# Altium footprint library OT Library.PcbLib: 396 footprints (part 11 of 25)
Each footprint in its own frame and in the unit in brackets; x right, y up, seen from the top. Pads: shape width x height; smd on the part's side, far side on the other; paste and mask are expansions set on the pad; w line width, h text height; cw(c..) or ccw(c..) is an arc to the next point about the centre after c.
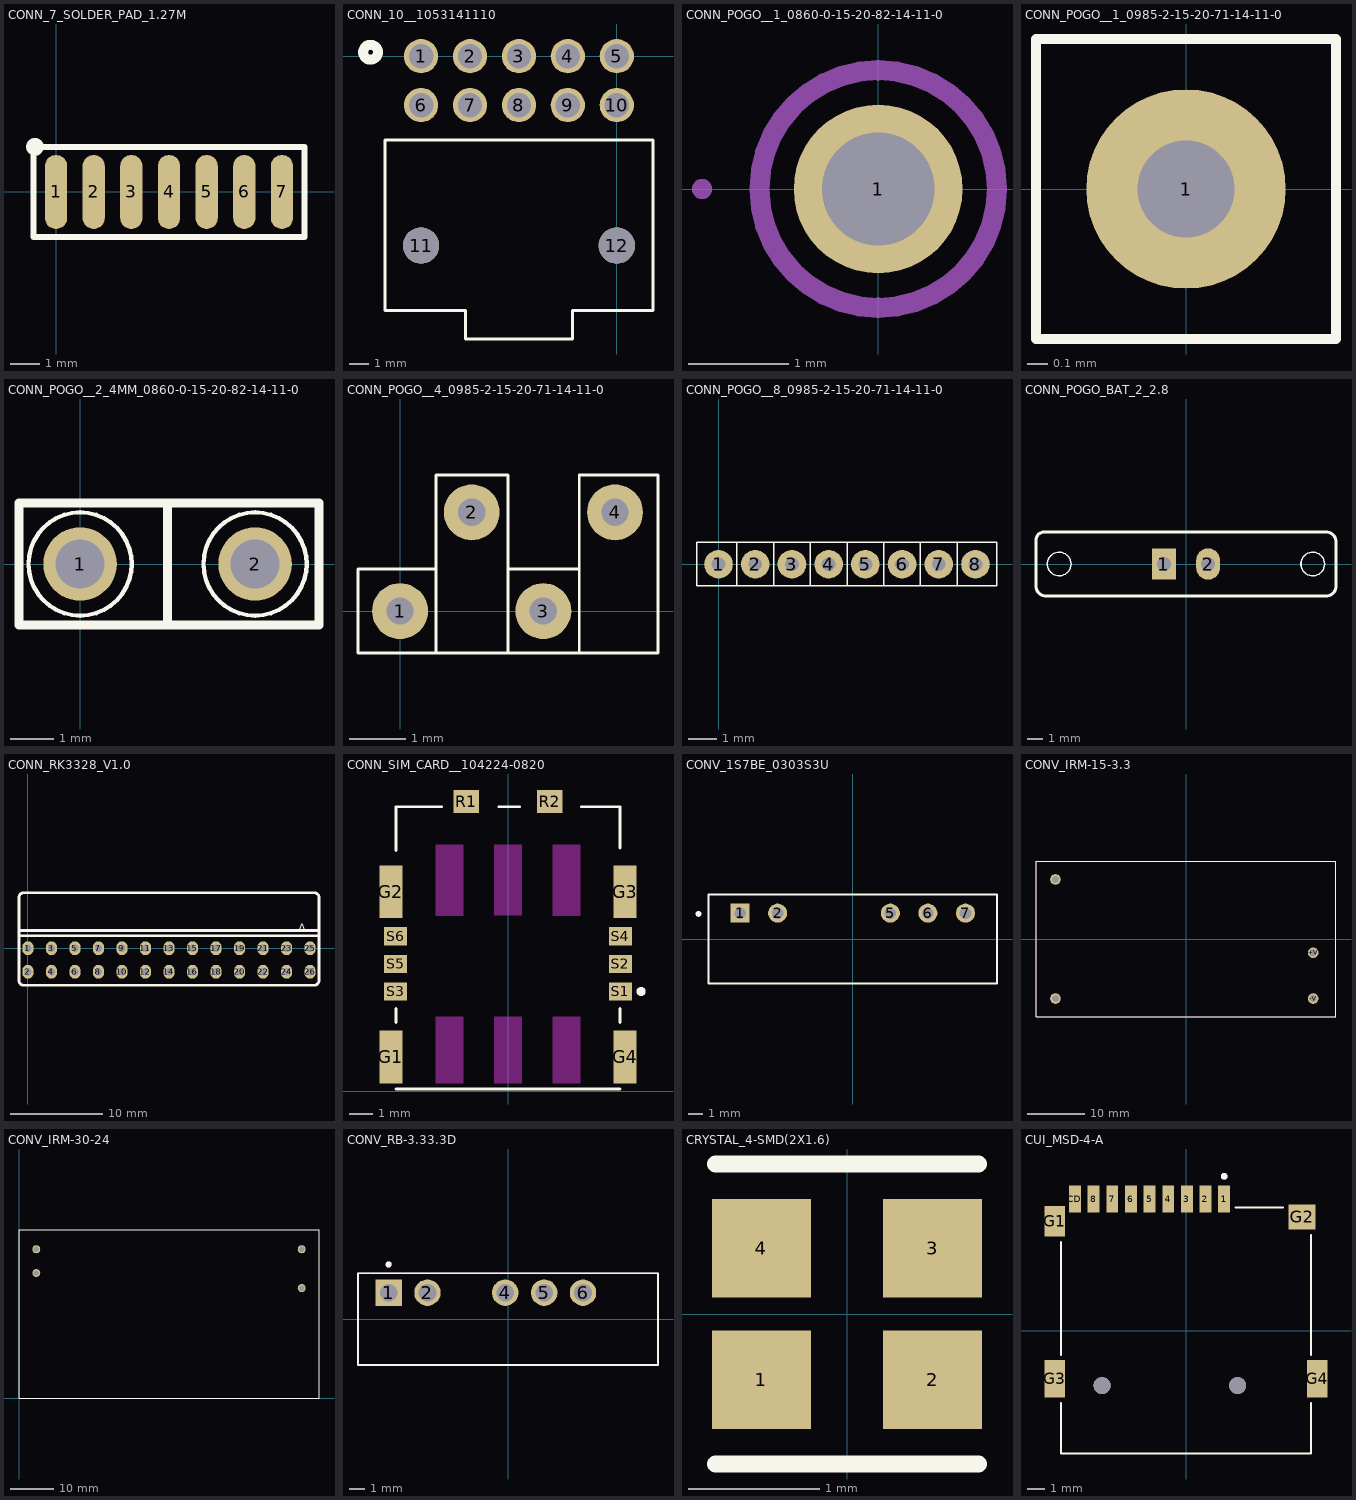
[diagram p10: the footprints below, top view; thin cyan lines are the x and y axes]

## CONN_7_SOLDER_PAD_1.27M [mm] "2.5MMX0.75MM"
pads (7):
  oval 0.75x2.5 smd: 1(0,0) 2(1.27,0) 3(2.54,0) 4(3.81,0) 5(5.08,0) 6(6.35,0) 7(7.62,0)
Top Overlay:
  circle w0.2: c-0.708,1.524 r0.2
  lines w0.2: -0.762,-1.524 8.382,-1.524 8.382,1.524 -0.762,1.524 -0.762,-1.524

## CONN_10__1053141110 [mil]
pads (12):
  round 69 / inner round 60 / far side round 69 hole 49 paste-34.5 mask+0: 1(-393.7,0) 2(-295.28,0) 3(-196.85,0) 4(-98.43,0) 5(0,0) 6(-393.7,-98.43) 7(-295.28,-98.43) 8(-196.85,-98.43) 9(-98.43,-98.43) 10(0,-98.43)
  round 73 / inner round 60 / far side round 73 hole 73 unplated paste+0 mask+0: 11(-393.7,-381.1) 12(0,-381.1)
Top Overlay:
  circle w20: c-495.35,8 r15
  lines w6: -466.35,-512.02 -466.35,-169.02 72.65,-169.02 72.65,-512.02 -89.35,-512.02 -89.35,-569.02 -304.35,-569.02 -304.35,-512.02 -466.35,-512.02
Bottom Overlay:
  circle w20: c-495.35,8 r15
3D body: height 362.2, standoff -123.62, extent -459.56,-564.01 69.57,13.06

## CONN_POGO__1_0860-0-15-20-82-14-11-0 [mm]
pads (1):
  round 1.677 / inner round 1.524 / far side round 1.677 hole 1.118: 1(0,0)
Assembly Top:
  lines w0.1: -1.18,0 cw(c0,0) 1.18,0 cw(c0,0) -1.18,0
Mechanical 22:
  lines w0.1: -1.8,0 ccw(c-1.75,0) -1.7,0 ccw(c-1.75,0) -1.8,0
  lines w0.2: -1.18,0 cw(c0,0) 1.18,0 cw(c0,0) -1.18,0
3D body: height 9.97, standoff -3.17, extent -1.181,-1.181 1.181,1.181

## CONN_POGO__1_0985-2-15-20-71-14-11-0 [mm]
pads (1):
  round 0.991 hole 0.483: 1(0,0)
Top Overlay:
  lines w0.05: -0.746,-0.746 0.746,-0.746 0.746,0.746 -0.746,0.746 -0.746,-0.746
3D body: height 6.27, standoff -4.83, extent -0.546,-0.546 0.546,0.546

## CONN_POGO__2_4MM_0860-0-15-20-82-14-11-0 [mm] "4MM"
pads (2):
  round 1.677 / inner round 1.524 / far side round 1.677 hole 1.118: 1(0,0) 2(4,0)
Top Overlay:
  lines w0.1: -1.18,0 ccw(c0,0) 1.18,0 ccw(c0,0) -1.18,0 ; 2.82,0 ccw(c4,0) 5.18,0 ccw(c4,0) 2.82,0
  lines w0.2: 2,-1.27 2,1.397 ; -1.397,-1.397 5.461,-1.397 5.461,1.397 -1.397,1.397 -1.397,-1.397
3D body: height 9.97, standoff -3.17, extent 2.819,-1.181 5.181,1.181
3D body: height 9.97, standoff -3.17, extent -1.181,-1.181 1.181,1.181

## CONN_POGO__4_0985-2-15-20-71-14-11-0 [mm] "1.27MM"
pads (4):
  round 0.991 hole 0.483: 1(0,0) 2(1.27,1.75) 3(2.54,0) 4(3.81,1.75)
Top Overlay:
  lines w0.05: 0.635,-0.746 0.635,0.746 ; 1.913,-0.746 1.913,0.746 ; 3.175,-0.746 3.175,0.746 ; 4.555,2.413 3.175,2.413 3.175,0.746 ; 4.572,2.413 4.572,0.729 4.572,-0.746 -0.746,-0.746 -0.746,0.746 0.635,0.746 ; 0.635,0.746 0.635,2.413 1.913,2.413 1.913,0.746 ; 1.913,0.746 3.175,0.746
3D body: height 6.27, standoff -4.83, extent -0.546,-0.546 0.546,0.546
3D body: height 6.27, standoff -4.83, extent 0.724,1.204 1.816,2.296
3D body: height 6.27, standoff -4.83, extent 1.994,-0.546 3.086,0.546
3D body: height 6.27, standoff -4.83, extent 3.264,1.204 4.356,2.296

## CONN_POGO__8_0985-2-15-20-71-14-11-0 [mm] "1.27MM"
pads (8):
  round 0.991 hole 0.483: 1(0,0) 2(1.27,0) 3(2.54,0) 4(3.81,0) 5(5.08,0) 6(6.35,0) 7(7.62,0) 8(8.89,0)
Top Overlay:
  lines w0.05: 0.635,-0.746 0.635,0.746 ; 1.913,-0.746 1.913,0.746 ; 3.175,-0.746 3.175,0.746 ; 4.445,-0.746 4.445,0.746 ; 5.723,-0.746 5.723,0.746 ; 6.985,-0.746 6.985,0.746 ; 8.255,-0.746 8.255,0.746 ; -0.746,-0.746 9.636,-0.746 9.636,0.762 -0.746,0.762 -0.746,-0.746
3D body: height 6.27, standoff -4.83, extent 8.344,-0.546 9.436,0.546
3D body: height 6.27, standoff -4.83, extent 7.074,-0.546 8.166,0.546
3D body: height 6.27, standoff -4.83, extent 5.804,-0.546 6.896,0.546
3D body: height 6.27, standoff -4.83, extent 4.534,-0.546 5.626,0.546
3D body: height 6.27, standoff -4.83, extent 3.264,-0.546 4.356,0.546
3D body: height 6.27, standoff -4.83, extent 1.994,-0.546 3.086,0.546
3D body: height 6.27, standoff -4.83, extent 0.724,-0.546 1.816,0.546
3D body: height 6.27, standoff -4.83, extent -0.546,-0.546 0.546,0.546

## CONN_POGO_BAT_2_2.8 [mm]
pads (2):
  rect 1.5x2 hole 0.9: 1(-1.4,0)
  oval 1.5x2 hole 0.9: 2(1.4,0)
Top Overlay:
  circle w0.1: c-8.05,0 r0.75
  circle w0.1: c8.05,0 r0.75
  lines w0.2: -9.525,-1.397 ccw(c-8.89,-1.397) -8.89,-2.032 8.89,-2.032 ccw(c8.89,-1.397) 9.525,-1.397 9.525,1.397 ccw(c8.89,1.397) 8.89,2.032 -9.017,2.032 ccw(c-9.017,1.524) -9.525,1.524 -9.525,0.381 -9.525,-0.381 -9.525,-1.397
3D body: height 4.01, standoff -1.79, extent -9.5,-2 9.5,2

## CONN_RK3328_V1.0 [mm]
pads (26):
  oval 1.2x1.5 hole 0.762: 1(0,0) 2(0,-2.54) 3(2.54,0) 4(2.54,-2.54) 5(5.08,0) 6(5.08,-2.54) 7(7.62,0) 8(7.62,-2.54) 9(10.16,0) 10(10.16,-2.54) 11(12.7,0) 12(12.7,-2.54) 13(15.24,0) 14(15.24,-2.54) 15(17.78,0) 16(17.78,-2.54) 17(20.32,0) 18(20.32,-2.54) 19(22.86,0) 20(22.86,-2.54) 21(25.4,0) 22(25.4,-2.54) 23(27.94,0) 24(27.94,-2.54) 25(30.48,0) 26(30.48,-2.54)
Top Overlay:
  lines w0.3: -0.914,1.346 31.369,1.346 ; -0.884,1.905 31.445,1.905 ; -0.96,-3.5 ccw(c-0.46,-3.5) -0.46,-4 30.94,-4 ccw(c30.94,-3.5) 31.44,-3.5 31.44,5.5 ccw(c30.94,5.5) 30.94,6 -0.46,6 ccw(c-0.46,5.5) -0.96,5.5 -0.96,-3.5
  text "A" at 29.185,1.393 h1.52
Outline:
  lines w0.1: -0.96,-3.5 ccw(c-0.46,-3.5) -0.46,-4 30.94,-4 ccw(c30.94,-3.5) 31.44,-3.5 31.44,5.5 ccw(c30.94,5.5) 30.94,6 -0.46,6 ccw(c-0.46,5.5) -0.96,5.5 -0.96,-3.5
3D body: height 8.51, standoff -2.64, extent -1.486,-3.788 32.042,1.165
3D body: height 19.35, standoff 2.97, extent -1.269,-4.029 31.751,5.971

## CONN_SIM_CARD__104224-0820 [mm]
pads (12):
  rect 1x2.3 smd: G1(-5.1,1.5) G2(-5.1,8.7) G3(5.1,8.7) G4(5.1,1.5)
  rect 1.1x1 smd: R1(-1.82,12.625) R2(1.82,12.625)
  rect 1x0.8 smd: S1(4.9,4.35) S2(4.9,5.55) S3(-4.9,4.35) S4(4.9,6.75) S5(-4.9,5.55) S6(-4.9,6.75)
Top Layer keep-out:
  region: 3.14,7.652 1.94,7.652 1.94,10.75 3.14,10.75
  region: -1.94,7.656 -3.142,7.656 -3.142,10.75 -1.94,10.75
  region: 0.6,7.663 -0.601,7.663 -0.601,10.75 0.6,10.75
  region: 3.14,0.351 1.943,0.351 1.943,3.25 3.14,3.25
  region: -1.94,0.351 -3.146,0.351 -3.146,3.25 -1.94,3.25
  region: 0.6,0.35 -0.601,0.35 -0.601,3.25 0.6,3.25
Top Overlay:
  circle w0.2: c5.8,4.35 r0.1
  lines w0.127: -4.875,0.1 4.875,0.1 ; -4.875,3 -4.875,3.6 ; -4.875,10.5 -4.875,12.4 -2.9,12.4 ; -0.4,12.4 0.5,12.4 ; 3.2,12.4 4.875,12.4 4.875,10.6 ; 4.875,3 4.875,3.6
3D body: height 1.23, standoff 0.02, extent -5.175,0 5.175,12.65

## CONV_1S7BE_0303S3U [mm]
height 10
pads (5):
  rect 1.288x1.288 / inner round 1.288 / far side rect 1.288x1.288 hole 0.78: 1(-7.62,1.75)
  round 1.288 hole 0.78: 2(-5.08,1.75) 5(2.54,1.75) 6(5.08,1.75) 7(7.62,1.75)
Top Overlay:
  circle w0.2: c-10.43,1.7 r0.1
  lines w0.127: -9.75,-3 9.75,-3 9.75,3 -9.75,3 -9.75,-3
3D body: height 10, standoff -2.95, extent -9.652,-3.048 9.652,3.048

## CONV_IRM-15-3.3 [mm]
pads (4):
  round 1.86 hole 1.24: +V(22.2,-2.4) -V(22.2,-10.4) AC/L(-22.8,10.4) AC/N(-22.8,-10.4)
Top Overlay:
  lines w0.127: -26.2,-13.6 -26.2,13.6 26.2,13.6 26.2,-13.6 -26.2,-13.6
3D Top:
  lines w0.127: -26.2,-13.6 26.2,-13.6 26.2,13.6 -26.2,13.6 -26.2,-13.6
3D body: height 24, standoff -3.5, extent -26.2,-13.6 26.2,13.6

## CONV_IRM-30-24 [mm]
pads (4):
  round 1.86 hole 1.24: +V(65.5,25.5) -V(65.5,34.5) AC/L(4,34.5) AC/N(4,29)
Top Overlay:
  lines w0.2: 0,0 0,39 69.5,39 69.5,0 0,0
3D body: height 24, standoff -3.5, extent 0.073,-0.044 69.573,38.956

## CONV_RB-3.33.3D [mm]
pads (5):
  rect 1.73x1.73 hole 1.15: 1(-7.8,1.73)
  round 1.73 hole 1.15: 2(-5.26,1.73) 4(-0.18,1.73) 5(2.36,1.73) 6(4.9,1.73)
Top Overlay:
  circle w0.2: c-7.8,3.575 r0.1
  lines w0.127: -9.8,-3 -9.8,3 9.8,3 9.8,-3 -9.8,-3
3D Top:
  circle w0.2: c-7.8,3.575 r0.1
  lines w0.127: -9.8,-3 -9.8,3 9.8,3 9.8,-3 -9.8,-3
3D body: height 9.6, standoff -4.6, extent -9.8,-3.01 9.8,3

## CRYSTAL_4-SMD(2X1.6) [mm] "0.079\" L x 0.063\" W (2.00mm x 1.60mm)"
height 0.55
pads (4):
  rect 0.75x0.75 smd: 1(-0.65,-0.5) 2(0.65,-0.5) 3(0.65,0.5) 4(-0.65,0.5)
Top Overlay:
  lines w0.127: -1,-1.14 1,-1.14 ; -1,1.14 1,1.14
  text "." at -1.02,-1.23 h0.51
3D body: height 0.59, standoff 0, extent -1,-0.8 1,0.8

## CUI_MSD-4-A [mm]
height 2
pads (15):
  rect 0.7x1.6 smd: 1(2.25,7.75) 2(1.15,7.75) 3(0.05,7.75) 4(-1.05,7.75) 5(-2.15,7.75) 6(-3.25,7.75) 7(-4.35,7.75) 8(-5.45,7.75) CD(-6.55,7.75)
  rect 1.2x1.8 smd: G1(-7.75,6.45)
  rect 1.6x1.5 smd: G2(6.85,6.7)
  rect 1.2x2.2 smd: G3(-7.75,-2.85) G4(7.75,-2.85)
  round 1 hole 1 unplated: ""(-4.95,-3.25) ""(3.05,-3.25)
Top Overlay:
  circle w0.2: c2.25,9.1 r0.1
  lines w0.127: -7.375,-4.27 -7.375,-7.25 7.375,-7.25 7.375,-4.27 ; -7.375,-1.43 -7.375,5.23 ; 2.92,7.25 5.73,7.25 ; 7.375,-1.43 7.375,5.63
3D Top:
  circle w0.2: c2.25,9.1 r0.1
3D body: height 1.8, standoff -0.6, extent -8.1,-7.341 8.05,7.709